# Altium footprint library Pin Header WR-PHD_2.54mm.PcbLib: 138 footprints (part 2 of 9)
Each footprint in its own frame and in the unit in brackets; x right, y up, seen from the top. Pads: shape width x height; smd on the part's side, far side on the other; paste and mask are expansions set on the pad; w line width, h text height; cw(c..) or ccw(c..) is an arc to the next point about the centre after c.
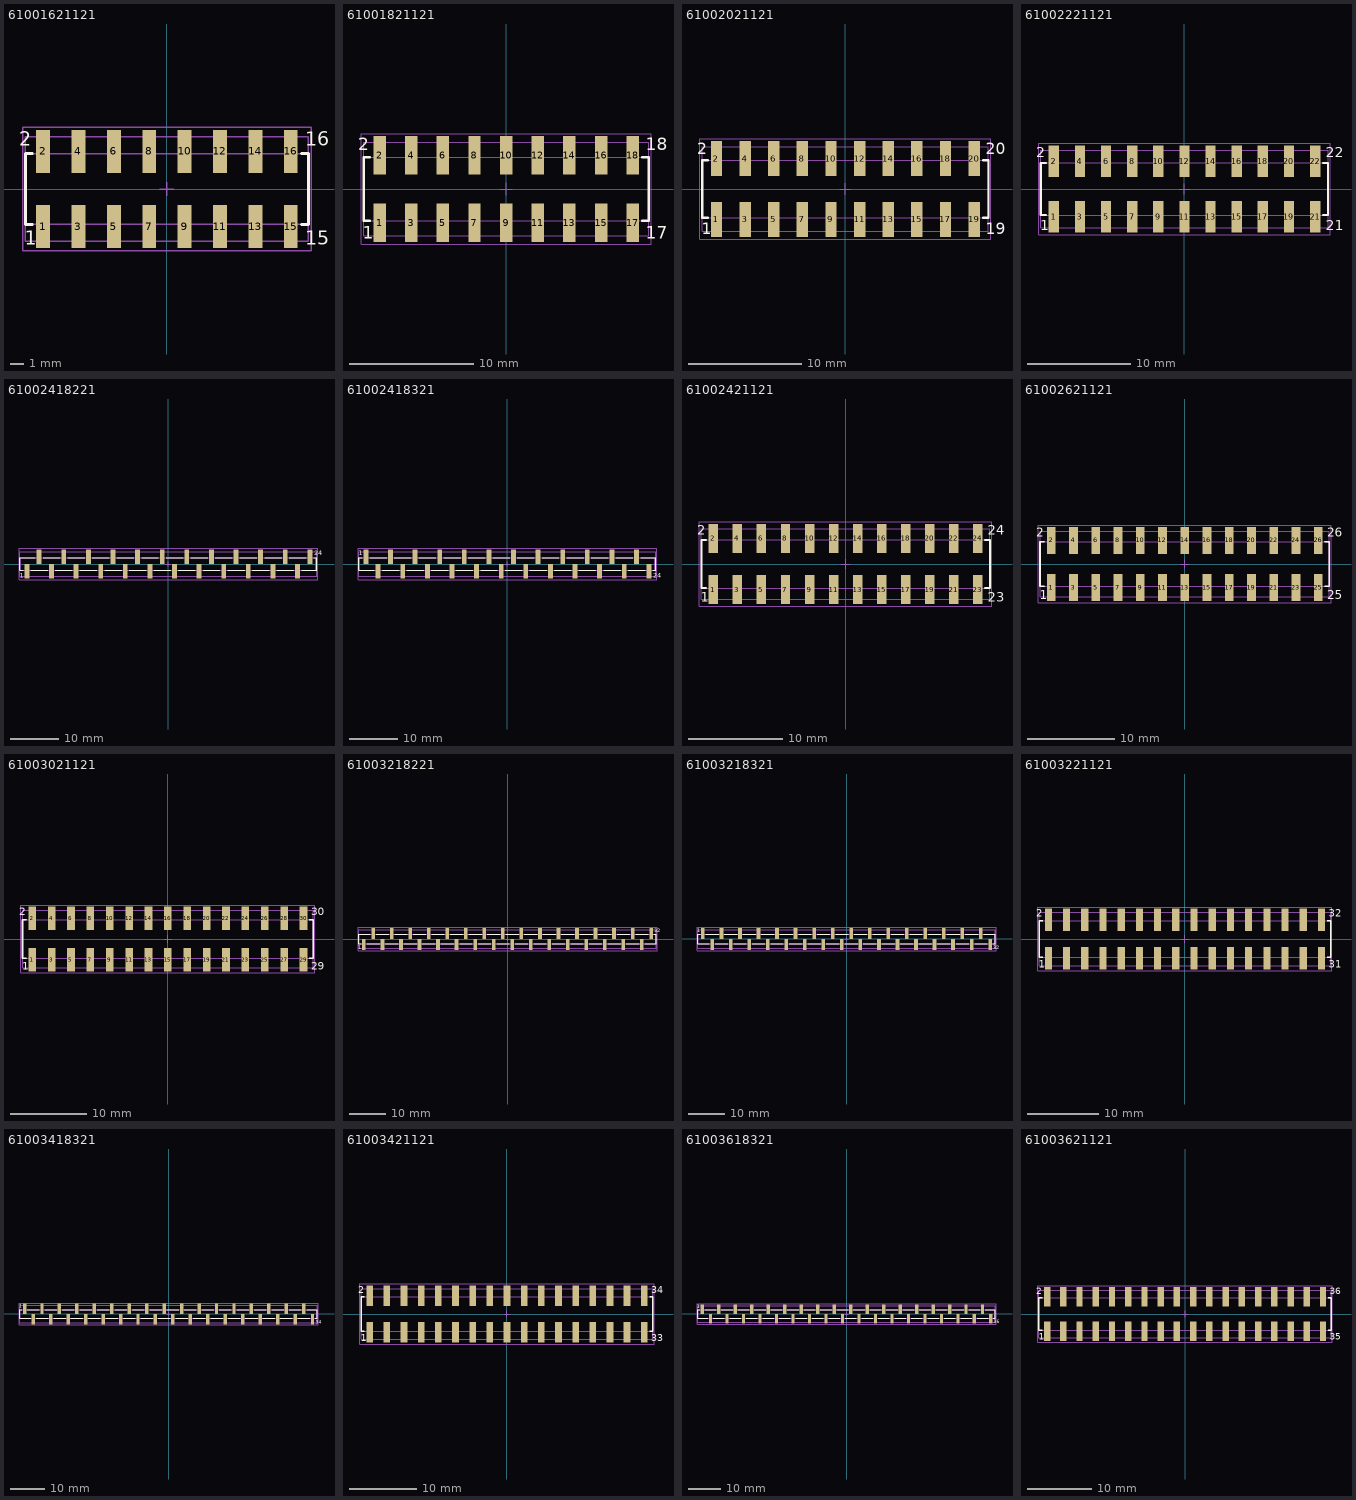
[diagram p1: the footprints below, top view; thin cyan lines are the x and y axes]

## 61001621121 [mm] "Pin Header, pitch 2.54 mm, SMD, Vertical, dual row, 16p"
height 9.6
pads (16):
  rect 1x3.1 smd: 1(-8.89,-2.7) 2(-8.89,2.7) 3(-6.35,-2.7) 4(-6.35,2.7) 5(-3.81,-2.7) 6(-3.81,2.7) 7(-1.27,-2.7) 8(-1.27,2.7) 9(1.27,-2.7) 10(1.27,2.7) 11(3.81,-2.7) 12(3.81,2.7) 13(6.35,-2.7) 14(6.35,2.7) 15(8.89,-2.7) 16(8.89,2.7)
Top Overlay:
  lines w0.2: -9.67,-2.54 -10.16,-2.54 -10.16,2.54 -9.67,2.54 ; 9.67,-2.54 10.16,-2.54 10.16,2.54 9.67,2.54
  text "16" at 9.92,3.1 h1
  text "15" at 9.92,-4 h1
  text "1" at -10.22,-4 h1
  text "2" at -10.62,3.1 h1
Mechanical 11:
  lines w0.1: -10.16,-2.54 10.16,-2.54 10.16,2.54 -10.16,2.54 -10.16,-2.54
Mechanical 13:
  lines w0.1: -10.16,-3.75 -10.16,3.75 10.16,3.75 10.16,-3.75 -10.16,-3.75
Mechanical 15:
  lines w0.1: -0.5,0 0.5,0 ; 0,-0.5 0,0.5 ; -10.36,-4.45 -10.36,4.45 10.36,4.45 10.36,-4.45 -10.36,-4.45
3D body "61001621121.stp": height 9.62, standoff 0.02, extent -10.16,-3.75 10.16,3.75

## 61001821121 [mm] "Pin Header, pitch 2.54 mm, SMD, Vertical, dual row, 18p"
height 9.6
pads (18):
  rect 1x3.1 smd: 1(-10.16,-2.7) 2(-10.16,2.7) 3(-7.62,-2.7) 4(-7.62,2.7) 5(-5.08,-2.7) 6(-5.08,2.7) 7(-2.54,-2.7) 8(-2.54,2.7) 9(0,-2.7) 10(0,2.7) 11(2.54,-2.7) 12(2.54,2.7) 13(5.08,-2.7) 14(5.08,2.7) 15(7.62,-2.7) 16(7.62,2.7) 17(10.16,-2.7) 18(10.16,2.7)
Top Overlay:
  lines w0.2: -10.94,-2.54 -11.43,-2.54 -11.43,2.54 -10.94,2.54 ; 10.94,-2.54 11.43,-2.54 11.43,2.54 10.94,2.54
  text "2" at -11.89,3.1 h1
  text "1" at -11.49,-4 h1
  text "17" at 11.19,-4 h1
  text "18" at 11.19,3.1 h1
Mechanical 11:
  lines w0.1: -11.43,-2.54 -11.43,2.54 11.43,2.54 11.43,-2.54 -11.43,-2.54
Mechanical 13:
  lines w0.1: -11.43,-3.75 11.43,-3.75 11.43,3.75 -11.43,3.75 -11.43,-3.75
Mechanical 15:
  lines w0.1: -0.5,0 0.5,0 ; 0,-0.5 0,0.5 ; -11.63,-4.45 11.63,-4.45 11.63,4.45 -11.63,4.45 -11.63,-4.45
3D body "61001821121.stp": height 9.62, standoff 0.02, extent -11.43,-3.75 11.43,3.75

## 61002021121 [mm] "Pin Header, pitch 2.54 mm, SMD, Vertical, dual row, 20p"
height 9.6
pads (20):
  rect 1x3.1 smd: 1(-11.43,-2.7) 2(-11.43,2.7) 3(-8.89,-2.7) 4(-8.89,2.7) 5(-6.35,-2.7) 6(-6.35,2.7) 7(-3.81,-2.7) 8(-3.81,2.7) 9(-1.27,-2.7) 10(-1.27,2.7) 11(1.27,-2.7) 12(1.27,2.7) 13(3.81,-2.7) 14(3.81,2.7) 15(6.35,-2.7) 16(6.35,2.7) 17(8.89,-2.7) 18(8.89,2.7) 19(11.43,-2.7) 20(11.43,2.7)
Top Overlay:
  lines w0.2: -12.21,-2.54 -12.7,-2.54 -12.7,2.54 -12.21,2.54 ; 12.21,-2.54 12.7,-2.54 12.7,2.54 12.21,2.54
  text "20" at 12.46,3.1 h1
  text "19" at 12.46,-4 h1
  text "1" at -12.76,-4 h1
  text "2" at -13.16,3.1 h1
Mechanical 11:
  lines w0.1: -12.7,-2.54 12.7,-2.54 12.7,2.54 -12.7,2.54 -12.7,-2.54
Mechanical 13:
  lines w0.1: -12.7,-3.75 -12.7,3.75 12.7,3.75 12.7,-3.75 -12.7,-3.75
Mechanical 15:
  lines w0.1: -0.5,0 0.5,0 ; 0,-0.5 0,0.5 ; -12.9,-4.45 -12.9,4.45 12.9,4.45 12.9,-4.45 -12.9,-4.45
3D body "61002021121.stp": height 9.62, standoff 0.02, extent -12.7,-3.75 12.7,3.75

## 61002221121 [mm] "Pin Header, pitch 2.54 mm, SMD, Vertical, dual row, 22p"
height 9.6
pads (22):
  rect 1x3.1 smd: 1(-12.7,-2.7) 2(-12.7,2.7) 3(-10.16,-2.7) 4(-10.16,2.7) 5(-7.62,-2.7) 6(-7.62,2.7) 7(-5.08,-2.7) 8(-5.08,2.7) 9(-2.54,-2.7) 10(-2.54,2.7) 11(0,-2.7) 12(0,2.7) 13(2.54,-2.7) 14(2.54,2.7) 15(5.08,-2.7) 16(5.08,2.7) 17(7.62,-2.7) 18(7.62,2.7) 19(10.16,-2.7) 20(10.16,2.7) 21(12.7,-2.7) 22(12.7,2.7)
Top Overlay:
  lines w0.2: -13.48,-2.54 -13.97,-2.54 -13.97,2.54 -13.48,2.54 ; 13.48,-2.54 13.97,-2.54 13.97,2.54 13.48,2.54
  text "22" at 13.73,3.1 h1
  text "21" at 13.73,-4 h1
  text "2" at -14.43,3.1 h1
  text "1" at -14.03,-4 h1
Mechanical 11:
  lines w0.1: -13.97,-2.54 -13.97,2.54 13.97,2.54 13.97,-2.54 -13.97,-2.54
Mechanical 13:
  lines w0.1: -13.97,-3.75 13.97,-3.75 13.97,3.75 -13.97,3.75 -13.97,-3.75
Mechanical 15:
  lines w0.1: -0.5,0 0.5,0 ; 0,-0.5 0,0.5 ; -14.17,-4.45 14.17,-4.45 14.17,4.45 -14.17,4.45 -14.17,-4.45
3D body "61002221121.stp": height 9.62, standoff 0.02, extent -13.97,-3.75 13.97,3.75

## 61002418221 [mm] "Pin Header, pitch 2.54 mm, SMD, Vertical, single row, 24p"
height 9.3
pads (24):
  rect 1x3 smd: 1(-29.21,-1.5) 2(-26.67,1.5) 3(-24.13,-1.5) 4(-21.59,1.5) 5(-19.05,-1.5) 6(-16.51,1.5) 7(-13.97,-1.5) 8(-11.43,1.5) 9(-8.89,-1.5) 10(-6.35,1.5) 11(-3.81,-1.5) 12(-1.27,1.5) 13(1.27,-1.5) 14(3.81,1.5) 15(6.35,-1.5) 16(8.89,1.5) 17(11.43,-1.5) 18(13.97,1.5) 19(16.51,-1.5) 20(19.05,1.5) 21(21.59,-1.5) 22(24.13,1.5) 23(26.67,-1.5) 24(29.21,1.5)
Top Overlay:
  lines w0.2: -30,-1.27 -30.63,-1.27 -30.63,1.27 -27.45,1.27 ; -28.4,-1.27 -24.9,-1.27 ; -25.86,1.27 -22.36,1.27 ; -23.32,-1.27 -19.82,-1.27 ; -20.78,1.27 -17.28,1.27 ; -18.24,-1.27 -14.74,-1.27 ; -15.7,1.27 -12.2,1.27 ; -13.16,-1.27 -9.66,-1.27 ; -10.62,1.27 -7.12,1.27 ; -8.08,-1.27 -4.58,-1.27 ; -5.54,1.27 -2.04,1.27 ; -3,-1.27 0.5,-1.27 ; -0.46,1.27 3.04,1.27 ; 2.08,-1.27 5.58,-1.27 ; 4.62,1.27 8.12,1.27 ; 7.16,-1.27 10.66,-1.27 ; 9.7,1.27 13.2,1.27 ; 12.24,-1.27 15.74,-1.27 ; 14.78,1.27 18.28,1.27 ; 17.32,-1.27 20.82,-1.27 ; 19.86,1.27 23.36,1.27 ; 22.4,-1.27 25.9,-1.27 ; 24.94,1.27 28.44,1.27 ; 27.5,-1.27 30.63,-1.27 30.63,1.27 30,1.27
  text "1" at -30.7,-2.8 h1
  text "24" at 30.1,1.8 h1
Mechanical 11:
  lines w0.1: -30.48,-1.27 -30.48,1.27 30.48,1.27 30.48,-1.27 -30.48,-1.27
Mechanical 13:
  lines w0.1: -30.63,-2.5 30.63,-2.5 30.63,2.5 -30.63,2.5 -30.63,-2.5
Mechanical 15:
  lines w0.1: -0.5,0 0.5,0 ; 0,-0.5 0,0.5 ; -30.83,-3.2 30.83,-3.2 30.83,3.2 -30.83,3.2 -30.83,-3.2
3D body "61002418221.stp": height 9.33, standoff 0, extent -30.48,-2.5 30.48,2.5

## 61002418321 [mm] "Pin Header, pitch 2.54 mm, SMD, Vertical, single row, 24p"
height 9.3
pads (24):
  rect 1x3 smd: 1(-29.21,1.5) 2(-26.67,-1.5) 3(-24.13,1.5) 4(-21.59,-1.5) 5(-19.05,1.5) 6(-16.51,-1.5) 7(-13.97,1.5) 8(-11.43,-1.5) 9(-8.89,1.5) 10(-6.35,-1.5) 11(-3.81,1.5) 12(-1.27,-1.5) 13(1.27,1.5) 14(3.81,-1.5) 15(6.35,1.5) 16(8.89,-1.5) 17(11.43,1.5) 18(13.97,-1.5) 19(16.51,1.5) 20(19.05,-1.5) 21(21.59,1.5) 22(24.13,-1.5) 23(26.67,1.5) 24(29.21,-1.5)
Top Overlay:
  lines w0.2: -30,1.27 -30.63,1.27 -30.63,-1.27 -27.45,-1.27 ; -28.4,1.27 -24.9,1.27 ; -25.86,-1.27 -22.36,-1.27 ; -23.32,1.27 -19.82,1.27 ; -20.78,-1.27 -17.28,-1.27 ; -18.24,1.27 -14.74,1.27 ; -15.7,-1.27 -12.2,-1.27 ; -13.16,1.27 -9.66,1.27 ; -10.62,-1.27 -7.12,-1.27 ; -8.08,1.27 -4.58,1.27 ; -5.54,-1.27 -2.04,-1.27 ; -3,1.27 0.5,1.27 ; -0.46,-1.27 3.04,-1.27 ; 2.08,1.27 5.58,1.27 ; 4.62,-1.27 8.12,-1.27 ; 7.16,1.27 10.66,1.27 ; 9.7,-1.27 13.2,-1.27 ; 12.24,1.27 15.74,1.27 ; 14.78,-1.27 18.28,-1.27 ; 17.32,1.27 20.82,1.27 ; 19.86,-1.27 23.36,-1.27 ; 22.4,1.27 25.9,1.27 ; 24.94,-1.27 28.44,-1.27 ; 27.5,1.27 30.63,1.27 30.63,-1.27 30,-1.27
  text "1" at -30.7,1.8 h1
  text "24" at 30.1,-2.8 h1
Mechanical 11:
  lines w0.1: -30.48,-1.27 30.48,-1.27 30.48,1.27 -30.48,1.27 -30.48,-1.27
Mechanical 13:
  lines w0.1: -30.63,-2.5 -30.63,2.5 30.63,2.5 30.63,-2.5 -30.63,-2.5
Mechanical 15:
  lines w0.1: -0.5,0 0.5,0 ; 0,-0.5 0,0.5 ; -30.83,-3.2 -30.83,3.2 30.83,3.2 30.83,-3.2 -30.83,-3.2
3D body "61002418321.stp": height 9.37, standoff 0.04, extent -30.48,-2.5 30.48,2.5

## 61002421121 [mm] "Pin Header, pitch 2.54 mm, SMD, Vertical, dual row, 24p"
height 9.6
pads (24):
  rect 1x3.1 smd: 1(-13.97,-2.7) 2(-13.97,2.7) 3(-11.43,-2.7) 4(-11.43,2.7) 5(-8.89,-2.7) 6(-8.89,2.7) 7(-6.35,-2.7) 8(-6.35,2.7) 9(-3.81,-2.7) 10(-3.81,2.7) 11(-1.27,-2.7) 12(-1.27,2.7) 13(1.27,-2.7) 14(1.27,2.7) 15(3.81,-2.7) 16(3.81,2.7) 17(6.35,-2.7) 18(6.35,2.7) 19(8.89,-2.7) 20(8.89,2.7) 21(11.43,-2.7) 22(11.43,2.7) 23(13.97,-2.7) 24(13.97,2.7)
Top Overlay:
  lines w0.2: -14.75,-2.54 -15.24,-2.54 -15.24,2.54 -14.75,2.54 ; 14.75,-2.54 15.24,-2.54 15.24,2.54 14.75,2.54
  text "1" at -15.3,-4 h1
  text "2" at -15.7,3.1 h1
  text "23" at 15,-4 h1
  text "24" at 15,3.1 h1
Mechanical 11:
  lines w0.1: -15.24,-2.54 15.24,-2.54 15.24,2.54 -15.24,2.54 -15.24,-2.54
Mechanical 13:
  lines w0.1: -15.24,-3.75 -15.24,3.75 15.24,3.75 15.24,-3.75 -15.24,-3.75
Mechanical 15:
  lines w0.1: -0.5,0 0.5,0 ; 0,-0.5 0,0.5 ; -15.44,-4.45 -15.44,4.45 15.44,4.45 15.44,-4.45 -15.44,-4.45
3D body "61002421121.stp": height 9.62, standoff 0.02, extent -15.24,-3.75 15.24,3.75

## 61002621121 [mm] "Pin Header, pitch 2.54 mm, SMD, Vertical, dual row, 26p"
height 9.6
pads (26):
  rect 1x3.1 smd: 1(-15.24,-2.7) 2(-15.24,2.7) 3(-12.7,-2.7) 4(-12.7,2.7) 5(-10.16,-2.7) 6(-10.16,2.7) 7(-7.62,-2.7) 8(-7.62,2.7) 9(-5.08,-2.7) 10(-5.08,2.7) 11(-2.54,-2.7) 12(-2.54,2.7) 13(0,-2.7) 14(0,2.7) 15(2.54,-2.7) 16(2.54,2.7) 17(5.08,-2.7) 18(5.08,2.7) 19(7.62,-2.7) 20(7.62,2.7) 21(10.16,-2.7) 22(10.16,2.7) 23(12.7,-2.7) 24(12.7,2.7) 25(15.24,-2.7) 26(15.24,2.7)
Top Overlay:
  lines w0.2: -16.02,-2.54 -16.51,-2.54 -16.51,2.54 -16.02,2.54 ; 16.02,-2.54 16.51,-2.54 16.51,2.54 16.02,2.54
  text "26" at 16.27,3.1 h1
  text "25" at 16.27,-4 h1
  text "2" at -16.97,3.1 h1
  text "1" at -16.57,-4 h1
Mechanical 11:
  lines w0.1: -16.51,-2.54 -16.51,2.54 16.51,2.54 16.51,-2.54 -16.51,-2.54
Mechanical 13:
  lines w0.1: -16.51,-3.75 16.51,-3.75 16.51,3.75 -16.51,3.75 -16.51,-3.75
Mechanical 15:
  lines w0.1: -0.5,0 0.5,0 ; 0,-0.5 0,0.5 ; -16.71,-4.45 16.71,-4.45 16.71,4.45 -16.71,4.45 -16.71,-4.45
3D body "61002621121.stp": height 9.62, standoff 0.02, extent -16.51,-3.75 16.51,3.75

## 61003021121 [mm] "Pin Header, pitch 2.54 mm, SMD, Vertical, dual row, 30p"
height 9.6
pads (30):
  rect 1x3.1 smd: 1(-17.78,-2.7) 2(-17.78,2.7) 3(-15.24,-2.7) 4(-15.24,2.7) 5(-12.7,-2.7) 6(-12.7,2.7) 7(-10.16,-2.7) 8(-10.16,2.7) 9(-7.62,-2.7) 10(-7.62,2.7) 11(-5.08,-2.7) 12(-5.08,2.7) 13(-2.54,-2.7) 14(-2.54,2.7) 15(0,-2.7) 16(0,2.7) 17(2.54,-2.7) 18(2.54,2.7) 19(5.08,-2.7) 20(5.08,2.7) 21(7.62,-2.7) 22(7.62,2.7) 23(10.16,-2.7) 24(10.16,2.7) 25(12.7,-2.7) 26(12.7,2.7) 27(15.24,-2.7) 28(15.24,2.7) 29(17.78,-2.7) 30(17.78,2.7)
Top Overlay:
  lines w0.2: -18.56,-2.54 -19.05,-2.54 -19.05,2.54 -18.56,2.54 ; 18.56,-2.54 19.05,-2.54 19.05,2.54 18.56,2.54
  text "1" at -19.11,-4 h1
  text "2" at -19.51,3.1 h1
  text "29" at 18.81,-4 h1
  text "30" at 18.81,3.1 h1
Mechanical 11:
  lines w0.1: -19.05,-2.54 19.05,-2.54 19.05,2.54 -19.05,2.54 -19.05,-2.54
Mechanical 13:
  lines w0.1: -19.05,-3.75 -19.05,3.75 19.05,3.75 19.05,-3.75 -19.05,-3.75
Mechanical 15:
  lines w0.1: -0.5,0 0.5,0 ; 0,-0.5 0,0.5 ; -19.25,-4.45 -19.25,4.45 19.25,4.45 19.25,-4.45 -19.25,-4.45
3D body "61003021121.stp": height 9.62, standoff 0.02, extent -19.05,-3.75 19.05,3.75

## 61003218221 [mm] "Pin Header, pitch 2.54 mm, SMD, Vertical, single row, 32p"
height 9.3
pads (32):
  rect 1x3 smd: 1(-39.37,-1.5) 2(-36.83,1.5) 3(-34.29,-1.5) 4(-31.75,1.5) 5(-29.21,-1.5) 6(-26.67,1.5) 7(-24.13,-1.5) 8(-21.59,1.5) 9(-19.05,-1.5) 10(-16.51,1.5) 11(-13.97,-1.5) 12(-11.43,1.5) 13(-8.89,-1.5) 14(-6.35,1.5) 15(-3.81,-1.5) 16(-1.27,1.5) 17(1.27,-1.5) 18(3.81,1.5) 19(6.35,-1.5) 20(8.89,1.5) 21(11.43,-1.5) 22(13.97,1.5) 23(16.51,-1.5) 24(19.05,1.5) 25(21.59,-1.5) 26(24.13,1.5) 27(26.67,-1.5) 28(29.21,1.5) 29(31.75,-1.5) 30(34.29,1.5) 31(36.83,-1.5) 32(39.37,1.5)
Top Overlay:
  lines w0.2: -40.16,-1.27 -40.79,-1.27 -40.79,1.27 -37.61,1.27 ; -38.56,-1.27 -35.06,-1.27 ; -36.02,1.27 -32.52,1.27 ; -33.48,-1.27 -29.98,-1.27 ; -30.94,1.27 -27.44,1.27 ; -28.4,-1.27 -24.9,-1.27 ; -25.86,1.27 -22.36,1.27 ; -23.32,-1.27 -19.82,-1.27 ; -20.78,1.27 -17.28,1.27 ; -18.24,-1.27 -14.74,-1.27 ; -15.7,1.27 -12.2,1.27 ; -13.16,-1.27 -9.66,-1.27 ; -10.62,1.27 -7.12,1.27 ; -8.08,-1.27 -4.58,-1.27 ; -5.54,1.27 -2.04,1.27 ; -3,-1.27 0.5,-1.27 ; -0.46,1.27 3.04,1.27 ; 2.08,-1.27 5.58,-1.27 ; 4.62,1.27 8.12,1.27 ; 7.16,-1.27 10.66,-1.27 ; 9.7,1.27 13.2,1.27 ; 12.24,-1.27 15.74,-1.27 ; 14.78,1.27 18.28,1.27 ; 17.32,-1.27 20.82,-1.27 ; 19.86,1.27 23.36,1.27 ; 22.4,-1.27 25.9,-1.27 ; 24.94,1.27 28.44,1.27 ; 27.48,-1.27 30.98,-1.27 ; 30.02,1.27 33.52,1.27 ; 32.56,-1.27 36.06,-1.27 ; 35.1,1.27 38.6,1.27 ; 37.66,-1.27 40.79,-1.27 40.79,1.27 40.16,1.27
  text "32" at 40.26,1.8 h1
  text "1" at -40.86,-2.8 h1
Mechanical 11:
  lines w0.1: -40.64,-1.27 40.64,-1.27 40.64,1.27 -40.64,1.27 -40.64,-1.27
Mechanical 13:
  lines w0.1: -40.79,-2.5 -40.79,2.5 40.79,2.5 40.79,-2.5 -40.79,-2.5
Mechanical 15:
  lines w0.1: -0.5,0 0.5,0 ; 0,-0.5 0,0.5 ; -40.99,-3.2 -40.99,3.2 40.99,3.2 40.99,-3.2 -40.99,-3.2
3D body "61003218221.stp": height 9.33, standoff 0, extent -40.64,-2.5 40.64,2.5

## 61003218321 [mm] "Pin Header, pitch 2.54 mm, SMD, Vertical, single row, 32p"
height 9.3
pads (32):
  rect 1x3 smd: 1(-39.37,1.5) 2(-36.83,-1.5) 3(-34.29,1.5) 4(-31.75,-1.5) 5(-29.21,1.5) 6(-26.67,-1.5) 7(-24.13,1.5) 8(-21.59,-1.5) 9(-19.05,1.5) 10(-16.51,-1.5) 11(-13.97,1.5) 12(-11.43,-1.5) 13(-8.89,1.5) 14(-6.35,-1.5) 15(-3.81,1.5) 16(-1.27,-1.5) 17(1.27,1.5) 18(3.81,-1.5) 19(6.35,1.5) 20(8.89,-1.5) 21(11.43,1.5) 22(13.97,-1.5) 23(16.51,1.5) 24(19.05,-1.5) 25(21.59,1.5) 26(24.13,-1.5) 27(26.67,1.5) 28(29.21,-1.5) 29(31.75,1.5) 30(34.29,-1.5) 31(36.83,1.5) 32(39.37,-1.5)
Top Overlay:
  lines w0.2: -40.16,1.27 -40.79,1.27 -40.79,-1.27 -37.61,-1.27 ; -38.56,1.27 -35.06,1.27 ; -36.02,-1.27 -32.52,-1.27 ; -33.48,1.27 -29.98,1.27 ; -30.94,-1.27 -27.44,-1.27 ; -28.4,1.27 -24.9,1.27 ; -25.86,-1.27 -22.36,-1.27 ; -23.32,1.27 -19.82,1.27 ; -20.78,-1.27 -17.28,-1.27 ; -18.24,1.27 -14.74,1.27 ; -15.7,-1.27 -12.2,-1.27 ; -13.16,1.27 -9.66,1.27 ; -10.62,-1.27 -7.12,-1.27 ; -8.08,1.27 -4.58,1.27 ; -5.54,-1.27 -2.04,-1.27 ; -3,1.27 0.5,1.27 ; -0.46,-1.27 3.04,-1.27 ; 2.08,1.27 5.58,1.27 ; 4.62,-1.27 8.12,-1.27 ; 7.16,1.27 10.66,1.27 ; 9.7,-1.27 13.2,-1.27 ; 12.24,1.27 15.74,1.27 ; 14.78,-1.27 18.28,-1.27 ; 17.32,1.27 20.82,1.27 ; 19.86,-1.27 23.36,-1.27 ; 22.4,1.27 25.9,1.27 ; 24.94,-1.27 28.44,-1.27 ; 27.48,1.27 30.98,1.27 ; 30.02,-1.27 33.52,-1.27 ; 32.56,1.27 36.06,1.27 ; 35.1,-1.27 38.6,-1.27 ; 37.66,1.27 40.79,1.27 40.79,-1.27 40.16,-1.27
  text "1" at -40.86,1.8 h1
  text "32" at 40.26,-2.8 h1
Mechanical 11:
  lines w0.1: -40.64,-1.27 -40.64,1.27 40.64,1.27 40.64,-1.27 -40.64,-1.27
Mechanical 13:
  lines w0.1: -40.79,-2.5 40.79,-2.5 40.79,2.5 -40.79,2.5 -40.79,-2.5
Mechanical 15:
  lines w0.1: -0.5,0 0.5,0 ; 0,-0.5 0,0.5 ; -40.99,-3.2 40.99,-3.2 40.99,3.2 -40.99,3.2 -40.99,-3.2
3D body "61003218321.stp": height 9.37, standoff 0.04, extent -40.64,-2.5 40.64,2.5

## 61003221121 [mm] "Pin Header, pitch 2.54 mm, SMD, Vertical, dual row, 32p"
height 9.6
pads (32):
  rect 1x3.1 smd: 1(-19.05,-2.7) 2(-19.05,2.7) 3(-16.51,-2.7) 4(-16.51,2.7) 5(-13.97,-2.7) 6(-13.97,2.7) 7(-11.43,-2.7) 8(-11.43,2.7) 9(-8.89,-2.7) 10(-8.89,2.7) 11(-6.35,-2.7) 12(-6.35,2.7) 13(-3.81,-2.7) 14(-3.81,2.7) 15(-1.27,-2.7) 16(-1.27,2.7) 17(1.27,-2.7) 18(1.27,2.7) 19(3.81,-2.7) 20(3.81,2.7) 21(6.35,-2.7) 22(6.35,2.7) 23(8.89,-2.7) 24(8.89,2.7) 25(11.43,-2.7) 26(11.43,2.7) 27(13.97,-2.7) 28(13.97,2.7) 29(16.51,-2.7) 30(16.51,2.7) 31(19.05,-2.7) 32(19.05,2.7)
Top Overlay:
  lines w0.2: -19.83,-2.54 -20.32,-2.54 -20.32,2.54 -19.83,2.54 ; 19.83,-2.54 20.32,-2.54 20.32,2.54 19.83,2.54
  text "32" at 20.08,3.1 h1
  text "31" at 20.08,-4 h1
  text "2" at -20.78,3.1 h1
  text "1" at -20.38,-4 h1
Mechanical 11:
  lines w0.1: -20.32,-2.54 -20.32,2.54 20.32,2.54 20.32,-2.54 -20.32,-2.54
Mechanical 13:
  lines w0.1: -20.32,-3.75 20.32,-3.75 20.32,3.75 -20.32,3.75 -20.32,-3.75
Mechanical 15:
  lines w0.1: -0.5,0 0.5,0 ; 0,-0.5 0,0.5 ; -20.52,-4.45 20.52,-4.45 20.52,4.45 -20.52,4.45 -20.52,-4.45
3D body "61003221121.stp": height 9.62, standoff 0.02, extent -20.32,-3.75 20.32,3.75

## 61003418321 [mm] "Pin Header, pitch 2.54 mm, SMD, Vertical, single row, 34p"
height 9.3
pads (34):
  rect 1x3 smd: 1(-41.91,1.5) 2(-39.37,-1.5) 3(-36.83,1.5) 4(-34.29,-1.5) 5(-31.75,1.5) 6(-29.21,-1.5) 7(-26.67,1.5) 8(-24.13,-1.5) 9(-21.59,1.5) 10(-19.05,-1.5) 11(-16.51,1.5) 12(-13.97,-1.5) 13(-11.43,1.5) 14(-8.89,-1.5) 15(-6.35,1.5) 16(-3.81,-1.5) 17(-1.27,1.5) 18(1.27,-1.5) 19(3.81,1.5) 20(6.35,-1.5) 21(8.89,1.5) 22(11.43,-1.5) 23(13.97,1.5) 24(16.51,-1.5) 25(19.05,1.5) 26(21.59,-1.5) 27(24.13,1.5) 28(26.67,-1.5) 29(29.21,1.5) 30(31.75,-1.5) 31(34.29,1.5) 32(36.83,-1.5) 33(39.37,1.5) 34(41.91,-1.5)
Top Overlay:
  lines w0.2: -42.7,1.27 -43.33,1.27 -43.33,-1.27 -40.15,-1.27 ; -41.1,1.27 -37.6,1.27 ; -38.56,-1.27 -35.06,-1.27 ; -36.02,1.27 -32.52,1.27 ; -33.48,-1.27 -29.98,-1.27 ; -30.94,1.27 -27.44,1.27 ; -28.4,-1.27 -24.9,-1.27 ; -25.86,1.27 -22.36,1.27 ; -23.32,-1.27 -19.82,-1.27 ; -20.78,1.27 -17.28,1.27 ; -18.24,-1.27 -14.74,-1.27 ; -15.7,1.27 -12.2,1.27 ; -13.16,-1.27 -9.66,-1.27 ; -10.62,1.27 -7.12,1.27 ; -8.08,-1.27 -4.58,-1.27 ; -5.54,1.27 -2.04,1.27 ; -3,-1.27 0.5,-1.27 ; -0.46,1.27 3.04,1.27 ; 2.08,-1.27 5.58,-1.27 ; 4.62,1.27 8.12,1.27 ; 7.16,-1.27 10.66,-1.27 ; 9.7,1.27 13.2,1.27 ; 12.24,-1.27 15.74,-1.27 ; 14.78,1.27 18.28,1.27 ; 17.32,-1.27 20.82,-1.27 ; 19.86,1.27 23.36,1.27 ; 22.4,-1.27 25.9,-1.27 ; 24.94,1.27 28.44,1.27 ; 27.48,-1.27 30.98,-1.27 ; 30.02,1.27 33.52,1.27 ; 32.56,-1.27 36.06,-1.27 ; 35.1,1.27 38.6,1.27 ; 37.64,-1.27 41.14,-1.27 ; 40.2,1.27 43.33,1.27 43.33,-1.27 42.7,-1.27
  text "34" at 42.8,-2.8 h1
  text "1" at -43.4,1.8 h1
Mechanical 11:
  lines w0.1: -43.18,-1.27 43.18,-1.27 43.18,1.27 -43.18,1.27 -43.18,-1.27
Mechanical 13:
  lines w0.1: -43.33,-2.5 -43.33,2.5 43.33,2.5 43.33,-2.5 -43.33,-2.5
Mechanical 15:
  lines w0.1: -0.5,0 0.5,0 ; 0,-0.5 0,0.5 ; -43.53,-3.2 -43.53,3.2 43.53,3.2 43.53,-3.2 -43.53,-3.2
3D body "61003418321.stp": height 9.37, standoff 0.04, extent -43.18,-2.5 43.18,2.5

## 61003421121 [mm] "Pin Header, pitch 2.54 mm, SMD, Vertical, dual row, 34p"
height 9.6
pads (34):
  rect 1x3.1 smd: 1(-20.32,-2.7) 2(-20.32,2.7) 3(-17.78,-2.7) 4(-17.78,2.7) 5(-15.24,-2.7) 6(-15.24,2.7) 7(-12.7,-2.7) 8(-12.7,2.7) 9(-10.16,-2.7) 10(-10.16,2.7) 11(-7.62,-2.7) 12(-7.62,2.7) 13(-5.08,-2.7) 14(-5.08,2.7) 15(-2.54,-2.7) 16(-2.54,2.7) 17(0,-2.7) 18(0,2.7) 19(2.54,-2.7) 20(2.54,2.7) 21(5.08,-2.7) 22(5.08,2.7) 23(7.62,-2.7) 24(7.62,2.7) 25(10.16,-2.7) 26(10.16,2.7) 27(12.7,-2.7) 28(12.7,2.7) 29(15.24,-2.7) 30(15.24,2.7) 31(17.78,-2.7) 32(17.78,2.7) 33(20.32,-2.7) 34(20.32,2.7)
Top Overlay:
  lines w0.2: -21.1,-2.54 -21.59,-2.54 -21.59,2.54 -21.1,2.54 ; 21.1,-2.54 21.59,-2.54 21.59,2.54 21.1,2.54
  text "34" at 21.35,3.1 h1
  text "33" at 21.35,-4 h1
  text "1" at -21.65,-4 h1
  text "2" at -22.05,3.1 h1
Mechanical 11:
  lines w0.1: -21.59,-2.54 21.59,-2.54 21.59,2.54 -21.59,2.54 -21.59,-2.54
Mechanical 13:
  lines w0.1: -21.59,-3.75 -21.59,3.75 21.59,3.75 21.59,-3.75 -21.59,-3.75
Mechanical 15:
  lines w0.1: -0.5,0 0.5,0 ; 0,-0.5 0,0.5 ; -21.79,-4.45 -21.79,4.45 21.79,4.45 21.79,-4.45 -21.79,-4.45
3D body "61003421121.stp": height 9.62, standoff 0.02, extent -21.59,-3.75 21.59,3.75

## 61003618321 [mm] "Pin Header, pitch 2.54 mm, SMD, Vertical, single row, 36p"
height 9.3
pads (36):
  rect 1x3 smd: 1(-44.45,1.5) 2(-41.91,-1.5) 3(-39.37,1.5) 4(-36.83,-1.5) 5(-34.29,1.5) 6(-31.75,-1.5) 7(-29.21,1.5) 8(-26.67,-1.5) 9(-24.13,1.5) 10(-21.59,-1.5) 11(-19.05,1.5) 12(-16.51,-1.5) 13(-13.97,1.5) 14(-11.43,-1.5) 15(-8.89,1.5) 16(-6.35,-1.5) 17(-3.81,1.5) 18(-1.27,-1.5) 19(1.27,1.5) 20(3.81,-1.5) 21(6.35,1.5) 22(8.89,-1.5) 23(11.43,1.5) 24(13.97,-1.5) 25(16.51,1.5) 26(19.05,-1.5) 27(21.59,1.5) 28(24.13,-1.5) 29(26.67,1.5) 30(29.21,-1.5) 31(31.75,1.5) 32(34.29,-1.5) 33(36.83,1.5) 34(39.37,-1.5) 35(41.91,1.5) 36(44.45,-1.5)
Top Overlay:
  lines w0.2: -45.24,1.27 -45.87,1.27 -45.87,-1.27 -42.69,-1.27 ; -43.64,1.27 -40.14,1.27 ; -41.1,-1.27 -37.6,-1.27 ; -38.56,1.27 -35.06,1.27 ; -36.02,-1.27 -32.52,-1.27 ; -33.48,1.27 -29.98,1.27 ; -30.94,-1.27 -27.44,-1.27 ; -28.4,1.27 -24.9,1.27 ; -25.86,-1.27 -22.36,-1.27 ; -23.32,1.27 -19.82,1.27 ; -20.78,-1.27 -17.28,-1.27 ; -18.24,1.27 -14.74,1.27 ; -15.7,-1.27 -12.2,-1.27 ; -13.16,1.27 -9.66,1.27 ; -10.62,-1.27 -7.12,-1.27 ; -8.08,1.27 -4.58,1.27 ; -5.54,-1.27 -2.04,-1.27 ; -3,1.27 0.5,1.27 ; -0.46,-1.27 3.04,-1.27 ; 2.08,1.27 5.58,1.27 ; 4.62,-1.27 8.12,-1.27 ; 7.16,1.27 10.66,1.27 ; 9.7,-1.27 13.2,-1.27 ; 12.24,1.27 15.74,1.27 ; 14.78,-1.27 18.28,-1.27 ; 17.32,1.27 20.82,1.27 ; 19.86,-1.27 23.36,-1.27 ; 22.4,1.27 25.9,1.27 ; 24.94,-1.27 28.44,-1.27 ; 27.48,1.27 30.98,1.27 ; 30.02,-1.27 33.52,-1.27 ; 32.56,1.27 36.06,1.27 ; 35.1,-1.27 38.6,-1.27 ; 37.64,1.27 41.14,1.27 ; 40.18,-1.27 43.68,-1.27 ; 42.74,1.27 45.87,1.27 45.87,-1.27 45.24,-1.27
  text "1" at -45.94,1.8 h1
  text "36" at 45.34,-2.8 h1
Mechanical 11:
  lines w0.1: -45.72,-1.27 45.72,-1.27 45.72,1.27 -45.72,1.27 -45.72,-1.27
Mechanical 13:
  lines w0.1: -45.87,-2.5 -45.87,2.5 45.87,2.5 45.87,-2.5 -45.87,-2.5
Mechanical 15:
  lines w0.1: -0.5,0 0.5,0 ; 0,-0.5 0,0.5 ; -46.07,-3.2 -46.07,3.2 46.07,3.2 46.07,-3.2 -46.07,-3.2
3D body "61003618321.stp": height 9.37, standoff 0.04, extent -45.72,-2.5 45.72,2.5

## 61003621121 [mm] "Pin Header, pitch 2.54 mm, SMD, Vertical, dual row, 36p"
height 9.6
pads (36):
  rect 1x3.1 smd: 1(-21.59,-2.7) 2(-21.59,2.7) 3(-19.05,-2.7) 4(-19.05,2.7) 5(-16.51,-2.7) 6(-16.51,2.7) 7(-13.97,-2.7) 8(-13.97,2.7) 9(-11.43,-2.7) 10(-11.43,2.7) 11(-8.89,-2.7) 12(-8.89,2.7) 13(-6.35,-2.7) 14(-6.35,2.7) 15(-3.81,-2.7) 16(-3.81,2.7) 17(-1.27,-2.7) 18(-1.27,2.7) 19(1.27,-2.7) 20(1.27,2.7) 21(3.81,-2.7) 22(3.81,2.7) 23(6.35,-2.7) 24(6.35,2.7) 25(8.89,-2.7) 26(8.89,2.7) 27(11.43,-2.7) 28(11.43,2.7) 29(13.97,-2.7) 30(13.97,2.7) 31(16.51,-2.7) 32(16.51,2.7) 33(19.05,-2.7) 34(19.05,2.7) 35(21.59,-2.7) 36(21.59,2.7)
Top Overlay:
  lines w0.2: -22.37,-2.54 -22.86,-2.54 -22.86,2.54 -22.37,2.54 ; 22.37,-2.54 22.86,-2.54 22.86,2.54 22.37,2.54
  text "1" at -22.92,-4 h1
  text "2" at -23.32,3.1 h1
  text "35" at 22.62,-4 h1
  text "36" at 22.62,3.1 h1
Mechanical 11:
  lines w0.1: -22.86,-2.54 22.86,-2.54 22.86,2.54 -22.86,2.54 -22.86,-2.54
Mechanical 13:
  lines w0.1: -22.86,-3.75 -22.86,3.75 22.86,3.75 22.86,-3.75 -22.86,-3.75
Mechanical 15:
  lines w0.1: -0.5,0 0.5,0 ; 0,-0.5 0,0.5 ; -23.06,-4.45 -23.06,4.45 23.06,4.45 23.06,-4.45 -23.06,-4.45
3D body "61003621121.stp": height 9.62, standoff 0.02, extent -22.86,-3.75 22.86,3.75